# Altium footprint library ST封装.PcbLib: 1336 footprints (part 84 of 109) (continued)
## SQFP24X24-304(N) [mm] (continued)
Top Overlay:
  lines w0.2: -0.4,-23.1 -0.4,-24.35 0.85,-24.35 ; -0.4,0.6 -0.4,1.05 0.4,1.85 0.85,1.85 ; 24.55,-24.35 25.8,-24.35 25.8,-23.1 ; 24.55,1.85 25.8,1.85 25.8,0.6

## SQFP24X24-304(T) [mm]
pads (304):
  rect 0.2x1.6 smd: 1(0,0)
  oval 0.2x1.6 smd: 2(-0.3,0) 3(-0.6,0) 4(-0.9,0) 5(-1.2,0) 6(-1.5,0) 7(-1.8,0) 8(-2.1,0) 9(-2.4,0) 10(-2.7,0) 11(-3,0) 12(-3.3,0) 13(-3.6,0) 14(-3.9,0) 15(-4.2,0) 16(-4.5,0) 17(-4.8,0) 18(-5.1,0) 19(-5.4,0) 20(-5.7,0) 21(-6,0) 22(-6.3,0) 23(-6.6,0) 24(-6.9,0) 25(-7.2,0) 26(-7.5,0) 27(-7.8,0) 28(-8.1,0) 29(-8.4,0) 30(-8.7,0) 31(-9,0) 32(-9.3,0) 33(-9.6,0) 34(-9.9,0) 35(-10.2,0) 36(-10.5,0) 37(-10.8,0) 38(-11.1,0) 115(-11.1,-25.4) 116(-10.8,-25.4) 117(-10.5,-25.4) 118(-10.2,-25.4) 119(-9.9,-25.4) 120(-9.6,-25.4) 121(-9.3,-25.4) 122(-9,-25.4) 123(-8.7,-25.4) 124(-8.4,-25.4) 125(-8.1,-25.4) 126(-7.8,-25.4) 127(-7.5,-25.4) 128(-7.2,-25.4) 129(-6.9,-25.4) 130(-6.6,-25.4) 131(-6.3,-25.4) 132(-6,-25.4) 133(-5.7,-25.4) 134(-5.4,-25.4) 135(-5.1,-25.4) 136(-4.8,-25.4) 137(-4.5,-25.4) 138(-4.2,-25.4) 139(-3.9,-25.4) 140(-3.6,-25.4) 141(-3.3,-25.4) 142(-3,-25.4) 143(-2.7,-25.4) 144(-2.4,-25.4) 145(-2.1,-25.4) 146(-1.8,-25.4) 147(-1.5,-25.4) 148(-1.2,-25.4) 149(-0.9,-25.4) 150(-0.6,-25.4) 151(-0.3,-25.4) 152(0,-25.4) 153(0.3,-25.4) 154(0.6,-25.4) 155(0.9,-25.4) 156(1.2,-25.4) 157(1.5,-25.4) 158(1.8,-25.4) 159(2.1,-25.4) 160(2.4,-25.4) 161(2.7,-25.4) 162(3,-25.4) 163(3.3,-25.4) 164(3.6,-25.4) 165(3.9,-25.4) 166(4.2,-25.4) 167(4.5,-25.4) 168(4.8,-25.4) 169(5.1,-25.4) 170(5.4,-25.4) 171(5.7,-25.4) 172(6,-25.4) 173(6.3,-25.4) 174(6.6,-25.4) 175(6.9,-25.4) 176(7.2,-25.4) 177(7.5,-25.4) 178(7.8,-25.4) 179(8.1,-25.4) 180(8.4,-25.4) 181(8.7,-25.4) 182(9,-25.4) 183(9.3,-25.4) 184(9.6,-25.4) 185(9.9,-25.4) 186(10.2,-25.4) 187(10.5,-25.4) 188(10.8,-25.4) 189(11.1,-25.4) 190(11.4,-25.4) 267(11.4,0) 268(11.1,0) 269(10.8,0) 270(10.5,0) 271(10.2,0) 272(9.9,0) 273(9.6,0) 274(9.3,0) 275(9,0) 276(8.7,0) 277(8.4,0) 278(8.1,0) 279(7.8,0) 280(7.5,0) 281(7.2,0) 282(6.9,0) 283(6.6,0) 284(6.3,0) 285(6,0) 286(5.7,0) 287(5.4,0) 288(5.1,0) 289(4.8,0) 290(4.5,0) 291(4.2,0) 292(3.9,0) 293(3.6,0) 294(3.3,0) 295(3,0) 296(2.7,0) 297(2.4,0) 298(2.1,0) 299(1.8,0) 300(1.5,0) 301(1.2,0) 302(0.9,0) 303(0.6,0) 304(0.3,0)
  oval 1.6x0.2 smd: 39(-12.55,-1.45) 40(-12.55,-1.75) 41(-12.55,-2.05) 42(-12.55,-2.35) 43(-12.55,-2.65) 44(-12.55,-2.95) 45(-12.55,-3.25) 46(-12.55,-3.55) 47(-12.55,-3.85) 48(-12.55,-4.15) 49(-12.55,-4.45) 50(-12.55,-4.75) 51(-12.55,-5.05) 52(-12.55,-5.35) 53(-12.55,-5.65) 54(-12.55,-5.95) 55(-12.55,-6.25) 56(-12.55,-6.55) 57(-12.55,-6.85) 58(-12.55,-7.15) 59(-12.55,-7.45) 60(-12.55,-7.75) 61(-12.55,-8.05) 62(-12.55,-8.35) 63(-12.55,-8.65) 64(-12.55,-8.95) 65(-12.55,-9.25) 66(-12.55,-9.55) 67(-12.55,-9.85) 68(-12.55,-10.15) 69(-12.55,-10.45) 70(-12.55,-10.75) 71(-12.55,-11.05) 72(-12.55,-11.35) 73(-12.55,-11.65) 74(-12.55,-11.95) 75(-12.55,-12.25) 76(-12.55,-12.55) 77(-12.55,-12.85) 78(-12.55,-13.15) 79(-12.55,-13.45) 80(-12.55,-13.75) 81(-12.55,-14.05) 82(-12.55,-14.35) 83(-12.55,-14.65) 84(-12.55,-14.95) 85(-12.55,-15.25) 86(-12.55,-15.55) 87(-12.55,-15.85) 88(-12.55,-16.15) 89(-12.55,-16.45) 90(-12.55,-16.75) 91(-12.55,-17.05) 92(-12.55,-17.35) 93(-12.55,-17.65) 94(-12.55,-17.95) 95(-12.55,-18.25) 96(-12.55,-18.55) 97(-12.55,-18.85) 98(-12.55,-19.15) 99(-12.55,-19.45) 100(-12.55,-19.75) 101(-12.55,-20.05) 102(-12.55,-20.35) 103(-12.55,-20.65) 104(-12.55,-20.95) 105(-12.55,-21.25) 106(-12.55,-21.55) 107(-12.55,-21.85) 108(-12.55,-22.15) 109(-12.55,-22.45) 110(-12.55,-22.75) 111(-12.55,-23.05) 112(-12.55,-23.35) 113(-12.55,-23.65) 114(-12.55,-23.95) 191(12.85,-23.95) 192(12.85,-23.65) 193(12.85,-23.35) 194(12.85,-23.05) 195(12.85,-22.75) 196(12.85,-22.45) 197(12.85,-22.15) 198(12.85,-21.85) 199(12.85,-21.55) 200(12.85,-21.25) 201(12.85,-20.95) 202(12.85,-20.65) 203(12.85,-20.35) 204(12.85,-20.05) 205(12.85,-19.75) 206(12.85,-19.45) 207(12.85,-19.15) 208(12.85,-18.85) 209(12.85,-18.55) 210(12.85,-18.25) 211(12.85,-17.95) 212(12.85,-17.65) 213(12.85,-17.35) 214(12.85,-17.05) 215(12.85,-16.75) 216(12.85,-16.45) 217(12.85,-16.15) 218(12.85,-15.85) 219(12.85,-15.55) 220(12.85,-15.25) 221(12.85,-14.95) 222(12.85,-14.65) 223(12.85,-14.35) 224(12.85,-14.05) 225(12.85,-13.75) 226(12.85,-13.45) 227(12.85,-13.15) 228(12.85,-12.85) 229(12.85,-12.55) 230(12.85,-12.25) 231(12.85,-11.95) 232(12.85,-11.65) 233(12.85,-11.35) 234(12.85,-11.05) 235(12.85,-10.75) 236(12.85,-10.45) 237(12.85,-10.15) 238(12.85,-9.85) 239(12.85,-9.55) 240(12.85,-9.25) 241(12.85,-8.95) 242(12.85,-8.65) 243(12.85,-8.35) 244(12.85,-8.05) 245(12.85,-7.75) 246(12.85,-7.45) 247(12.85,-7.15) 248(12.85,-6.85) 249(12.85,-6.55) 250(12.85,-6.25) 251(12.85,-5.95) 252(12.85,-5.65) 253(12.85,-5.35) 254(12.85,-5.05) 255(12.85,-4.75) 256(12.85,-4.45) 257(12.85,-4.15) 258(12.85,-3.85) 259(12.85,-3.55) 260(12.85,-3.25) 261(12.85,-2.95) 262(12.85,-2.65) 263(12.85,-2.35) 264(12.85,-2.05) 265(12.85,-1.75) 266(12.85,-1.45)
Top Overlay:
  lines w0.2: -12.95,-24.55 -12.95,-25.8 -11.7,-25.8 ; -12.95,-0.85 -12.95,-0.4 -12.15,0.4 -11.7,0.4 ; 12,-25.8 13.25,-25.8 13.25,-24.55 ; 12,0.4 13.25,0.4 13.25,-0.85

## SQFP28X28-208(N) [mm]
pads (208):
  rect 1.6x0.4 smd: 1(0,0)
  oval 1.6x0.4 smd: 2(0,-0.5) 3(0,-1) 4(0,-1.5) 5(0,-2) 6(0,-2.5) 7(0,-3) 8(0,-3.5) 9(0,-4) 10(0,-4.5) 11(0,-5) 12(0,-5.5) 13(0,-6) 14(0,-6.5) 15(0,-7) 16(0,-7.5) 17(0,-8) 18(0,-8.5) 19(0,-9) 20(0,-9.5) 21(0,-10) 22(0,-10.5) 23(0,-11) 24(0,-11.5) 25(0,-12) 26(0,-12.5) 27(0,-13) 28(0,-13.5) 29(0,-14) 30(0,-14.5) 31(0,-15) 32(0,-15.5) 33(0,-16) 34(0,-16.5) 35(0,-17) 36(0,-17.5) 37(0,-18) 38(0,-18.5) 39(0,-19) 40(0,-19.5) 41(0,-20) 42(0,-20.5) 43(0,-21) 44(0,-21.5) 45(0,-22) 46(0,-22.5) 47(0,-23) 48(0,-23.5) 49(0,-24) 50(0,-24.5) 51(0,-25) 52(0,-25.5) 105(29.4,-25.5) 106(29.4,-25) 107(29.4,-24.5) 108(29.4,-24) 109(29.4,-23.5) 110(29.4,-23) 111(29.4,-22.5) 112(29.4,-22) 113(29.4,-21.5) 114(29.4,-21) 115(29.4,-20.5) 116(29.4,-20) 117(29.4,-19.5) 118(29.4,-19) 119(29.4,-18.5) 120(29.4,-18) 121(29.4,-17.5) 122(29.4,-17) 123(29.4,-16.5) 124(29.4,-16) 125(29.4,-15.5) 126(29.4,-15) 127(29.4,-14.5) 128(29.4,-14) 129(29.4,-13.5) 130(29.4,-13) 131(29.4,-12.5) 132(29.4,-12) 133(29.4,-11.5) 134(29.4,-11) 135(29.4,-10.5) 136(29.4,-10) 137(29.4,-9.5) 138(29.4,-9) 139(29.4,-8.5) 140(29.4,-8) 141(29.4,-7.5) 142(29.4,-7) 143(29.4,-6.5) 144(29.4,-6) 145(29.4,-5.5) 146(29.4,-5) 147(29.4,-4.5) 148(29.4,-4) 149(29.4,-3.5) 150(29.4,-3) 151(29.4,-2.5) 152(29.4,-2) 153(29.4,-1.5) 154(29.4,-1) 155(29.4,-0.5) 156(29.4,0)
  oval 0.4x1.6 smd: 53(1.95,-27.45) 54(2.45,-27.45) 55(2.95,-27.45) 56(3.45,-27.45) 57(3.95,-27.45) 58(4.45,-27.45) 59(4.95,-27.45) 60(5.45,-27.45) 61(5.95,-27.45) 62(6.45,-27.45) 63(6.95,-27.45) 64(7.45,-27.45) 65(7.95,-27.45) 66(8.45,-27.45) 67(8.95,-27.45) 68(9.45,-27.45) 69(9.95,-27.45) 70(10.45,-27.45) 71(10.95,-27.45) 72(11.45,-27.45) 73(11.95,-27.45) 74(12.45,-27.45) 75(12.95,-27.45) 76(13.45,-27.45) 77(13.95,-27.45) 78(14.45,-27.45) 79(14.95,-27.45) 80(15.45,-27.45) 81(15.95,-27.45) 82(16.45,-27.45) 83(16.95,-27.45) 84(17.45,-27.45) 85(17.95,-27.45) 86(18.45,-27.45) 87(18.95,-27.45) 88(19.45,-27.45) 89(19.95,-27.45) 90(20.45,-27.45) 91(20.95,-27.45) 92(21.45,-27.45) 93(21.95,-27.45) 94(22.45,-27.45) 95(22.95,-27.45) 96(23.45,-27.45) 97(23.95,-27.45) 98(24.45,-27.45) 99(24.95,-27.45) 100(25.45,-27.45) 101(25.95,-27.45) 102(26.45,-27.45) 103(26.95,-27.45) 104(27.45,-27.45) 157(27.45,1.95) 158(26.95,1.95) 159(26.45,1.95) 160(25.95,1.95) 161(25.45,1.95) 162(24.95,1.95) 163(24.45,1.95) 164(23.95,1.95) 165(23.45,1.95) 166(22.95,1.95) 167(22.45,1.95) 168(21.95,1.95) 169(21.45,1.95) 170(20.95,1.95) 171(20.45,1.95) 172(19.95,1.95) 173(19.45,1.95) 174(18.95,1.95) 175(18.45,1.95) 176(17.95,1.95) 177(17.45,1.95) 178(16.95,1.95) 179(16.45,1.95) 180(15.95,1.95) 181(15.45,1.95) 182(14.95,1.95) 183(14.45,1.95) 184(13.95,1.95) 185(13.45,1.95) 186(12.95,1.95) 187(12.45,1.95) 188(11.95,1.95) 189(11.45,1.95) 190(10.95,1.95) 191(10.45,1.95) 192(9.95,1.95) 193(9.45,1.95) 194(8.95,1.95) 195(8.45,1.95) 196(7.95,1.95) 197(7.45,1.95) 198(6.95,1.95) 199(6.45,1.95) 200(5.95,1.95) 201(5.45,1.95) 202(4.95,1.95) 203(4.45,1.95) 204(3.95,1.95) 205(3.45,1.95) 206(2.95,1.95) 207(2.45,1.95) 208(1.95,1.95)
Top Overlay:
  lines w0.2: -0.4,-26.2 -0.4,-27.85 1.25,-27.85 ; -0.4,0.7 -0.4,1.55 0.4,2.35 1.25,2.35 ; 28.15,-27.85 29.8,-27.85 29.8,-26.2 ; 28.15,2.35 29.8,2.35 29.8,0.7

## SQFP28X28-216(N) [mm]
pads (216):
  rect 1.6x0.4 smd: 1(0,0)
  oval 1.6x0.4 smd: 2(0,-0.5) 3(0,-1) 4(0,-1.5) 5(0,-2) 6(0,-2.5) 7(0,-3) 8(0,-3.5) 9(0,-4) 10(0,-4.5) 11(0,-5) 12(0,-5.5) 13(0,-6) 14(0,-6.5) 15(0,-7) 16(0,-7.5) 17(0,-8) 18(0,-8.5) 19(0,-9) 20(0,-9.5) 21(0,-10) 22(0,-10.5) 23(0,-11) 24(0,-11.5) 25(0,-12) 26(0,-12.5) 27(0,-13) 28(0,-13.5) 29(0,-14) 30(0,-14.5) 31(0,-15) 32(0,-15.5) 33(0,-16) 34(0,-16.5) 35(0,-17) 36(0,-17.5) 37(0,-18) 38(0,-18.5) 39(0,-19) 40(0,-19.5) 41(0,-20) 42(0,-20.5) 43(0,-21) 44(0,-21.5) 45(0,-22) 46(0,-22.5) 47(0,-23) 48(0,-23.5) 49(0,-24) 50(0,-24.5) 51(0,-25) 52(0,-25.5) 53(0,-26) 54(0,-26.5) 109(29.4,-26.5) 110(29.4,-26) 111(29.4,-25.5) 112(29.4,-25) 113(29.4,-24.5) 114(29.4,-24) 115(29.4,-23.5) 116(29.4,-23) 117(29.4,-22.5) 118(29.4,-22) 119(29.4,-21.5) 120(29.4,-21) 121(29.4,-20.5) 122(29.4,-20) 123(29.4,-19.5) 124(29.4,-19) 125(29.4,-18.5) 126(29.4,-18) 127(29.4,-17.5) 128(29.4,-17) 129(29.4,-16.5) 130(29.4,-16) 131(29.4,-15.5) 132(29.4,-15) 133(29.4,-14.5) 134(29.4,-14) 135(29.4,-13.5) 136(29.4,-13) 137(29.4,-12.5) 138(29.4,-12) 139(29.4,-11.5) 140(29.4,-11) 141(29.4,-10.5) 142(29.4,-10) 143(29.4,-9.5) 144(29.4,-9) 145(29.4,-8.5) 146(29.4,-8) 147(29.4,-7.5) 148(29.4,-7) 149(29.4,-6.5) 150(29.4,-6) 151(29.4,-5.5) 152(29.4,-5) 153(29.4,-4.5) 154(29.4,-4) 155(29.4,-3.5) 156(29.4,-3) 157(29.4,-2.5) 158(29.4,-2) 159(29.4,-1.5) 160(29.4,-1) 161(29.4,-0.5) 162(29.4,0)
  oval 0.4x1.6 smd: 55(1.45,-27.95) 56(1.95,-27.95) 57(2.45,-27.95) 58(2.95,-27.95) 59(3.45,-27.95) 60(3.95,-27.95) 61(4.45,-27.95) 62(4.95,-27.95) 63(5.45,-27.95) 64(5.95,-27.95) 65(6.45,-27.95) 66(6.95,-27.95) 67(7.45,-27.95) 68(7.95,-27.95) 69(8.45,-27.95) 70(8.95,-27.95) 71(9.45,-27.95) 72(9.95,-27.95) 73(10.45,-27.95) 74(10.95,-27.95) 75(11.45,-27.95) 76(11.95,-27.95) 77(12.45,-27.95) 78(12.95,-27.95) 79(13.45,-27.95) 80(13.95,-27.95) 81(14.45,-27.95) 82(14.95,-27.95) 83(15.45,-27.95) 84(15.95,-27.95) 85(16.45,-27.95) 86(16.95,-27.95) 87(17.45,-27.95) 88(17.95,-27.95) 89(18.45,-27.95) 90(18.95,-27.95) 91(19.45,-27.95) 92(19.95,-27.95) 93(20.45,-27.95) 94(20.95,-27.95) 95(21.45,-27.95) 96(21.95,-27.95) 97(22.45,-27.95) 98(22.95,-27.95) 99(23.45,-27.95) 100(23.95,-27.95) 101(24.45,-27.95) 102(24.95,-27.95) 103(25.45,-27.95) 104(25.95,-27.95) 105(26.45,-27.95) 106(26.95,-27.95) 107(27.45,-27.95) 108(27.95,-27.95) 163(27.95,1.45) 164(27.45,1.45) 165(26.95,1.45) 166(26.45,1.45) 167(25.95,1.45) 168(25.45,1.45) 169(24.95,1.45) 170(24.45,1.45) 171(23.95,1.45) 172(23.45,1.45) 173(22.95,1.45) 174(22.45,1.45) 175(21.95,1.45) 176(21.45,1.45) 177(20.95,1.45) 178(20.45,1.45) 179(19.95,1.45) 180(19.45,1.45) 181(18.95,1.45) 182(18.45,1.45) 183(17.95,1.45) 184(17.45,1.45) 185(16.95,1.45) 186(16.45,1.45) 187(15.95,1.45) 188(15.45,1.45) 189(14.95,1.45) 190(14.45,1.45) 191(13.95,1.45) 192(13.45,1.45) 193(12.95,1.45) 194(12.45,1.45) 195(11.95,1.45) 196(11.45,1.45) 197(10.95,1.45) 198(10.45,1.45) 199(9.95,1.45) 200(9.45,1.45) 201(8.95,1.45) 202(8.45,1.45) 203(7.95,1.45) 204(7.45,1.45) 205(6.95,1.45) 206(6.45,1.45) 207(5.95,1.45) 208(5.45,1.45) 209(4.95,1.45) 210(4.45,1.45) 211(3.95,1.45) 212(3.45,1.45) 213(2.95,1.45) 214(2.45,1.45) 215(1.95,1.45) 216(1.45,1.45)
Top Overlay:
  lines w0.2: -0.4,-27.2 -0.4,-28.35 0.75,-28.35 ; -0.4,0.7 -0.4,1.05 0.4,1.85 0.75,1.85 ; 28.65,-28.35 29.8,-28.35 29.8,-27.2 ; 28.65,1.85 29.8,1.85 29.8,0.7

## SQFP28X28-216(T) [mm]
pads (216):
  rect 0.4x1.6 smd: 1(0,0)
  oval 0.4x1.6 smd: 2(-0.5,0) 3(-1,0) 4(-1.5,0) 5(-2,0) 6(-2.5,0) 7(-3,0) 8(-3.5,0) 9(-4,0) 10(-4.5,0) 11(-5,0) 12(-5.5,0) 13(-6,0) 14(-6.5,0) 15(-7,0) 16(-7.5,0) 17(-8,0) 18(-8.5,0) 19(-9,0) 20(-9.5,0) 21(-10,0) 22(-10.5,0) 23(-11,0) 24(-11.5,0) 25(-12,0) 26(-12.5,0) 27(-13,0) 82(-13,-29.4) 83(-12.5,-29.4) 84(-12,-29.4) 85(-11.5,-29.4) 86(-11,-29.4) 87(-10.5,-29.4) 88(-10,-29.4) 89(-9.5,-29.4) 90(-9,-29.4) 91(-8.5,-29.4) 92(-8,-29.4) 93(-7.5,-29.4) 94(-7,-29.4) 95(-6.5,-29.4) 96(-6,-29.4) 97(-5.5,-29.4) 98(-5,-29.4) 99(-4.5,-29.4) 100(-4,-29.4) 101(-3.5,-29.4) 102(-3,-29.4) 103(-2.5,-29.4) 104(-2,-29.4) 105(-1.5,-29.4) 106(-1,-29.4) 107(-0.5,-29.4) 108(0,-29.4) 109(0.5,-29.4) 110(1,-29.4) 111(1.5,-29.4) 112(2,-29.4) 113(2.5,-29.4) 114(3,-29.4) 115(3.5,-29.4) 116(4,-29.4) 117(4.5,-29.4) 118(5,-29.4) 119(5.5,-29.4) 120(6,-29.4) 121(6.5,-29.4) 122(7,-29.4) 123(7.5,-29.4) 124(8,-29.4) 125(8.5,-29.4) 126(9,-29.4) 127(9.5,-29.4) 128(10,-29.4) 129(10.5,-29.4) 130(11,-29.4) 131(11.5,-29.4) 132(12,-29.4) 133(12.5,-29.4) 134(13,-29.4) 135(13.5,-29.4) 190(13.5,0) 191(13,0) 192(12.5,0) 193(12,0) 194(11.5,0) 195(11,0) 196(10.5,0) 197(10,0) 198(9.5,0) 199(9,0) 200(8.5,0) 201(8,0) 202(7.5,0) 203(7,0) 204(6.5,0) 205(6,0) 206(5.5,0) 207(5,0) 208(4.5,0) 209(4,0) 210(3.5,0) 211(3,0) 212(2.5,0) 213(2,0) 214(1.5,0) 215(1,0) 216(0.5,0)
  oval 1.6x0.4 smd: 28(-14.45,-1.45) 29(-14.45,-1.95) 30(-14.45,-2.45) 31(-14.45,-2.95) 32(-14.45,-3.45) 33(-14.45,-3.95) 34(-14.45,-4.45) 35(-14.45,-4.95) 36(-14.45,-5.45) 37(-14.45,-5.95) 38(-14.45,-6.45) 39(-14.45,-6.95) 40(-14.45,-7.45) 41(-14.45,-7.95) 42(-14.45,-8.45) 43(-14.45,-8.95) 44(-14.45,-9.45) 45(-14.45,-9.95) 46(-14.45,-10.45) 47(-14.45,-10.95) 48(-14.45,-11.45) 49(-14.45,-11.95) 50(-14.45,-12.45) 51(-14.45,-12.95) 52(-14.45,-13.45) 53(-14.45,-13.95) 54(-14.45,-14.45) 55(-14.45,-14.95) 56(-14.45,-15.45) 57(-14.45,-15.95) 58(-14.45,-16.45) 59(-14.45,-16.95) 60(-14.45,-17.45) 61(-14.45,-17.95) 62(-14.45,-18.45) 63(-14.45,-18.95) 64(-14.45,-19.45) 65(-14.45,-19.95) 66(-14.45,-20.45) 67(-14.45,-20.95) 68(-14.45,-21.45) 69(-14.45,-21.95) 70(-14.45,-22.45) 71(-14.45,-22.95) 72(-14.45,-23.45) 73(-14.45,-23.95) 74(-14.45,-24.45) 75(-14.45,-24.95) 76(-14.45,-25.45) 77(-14.45,-25.95) 78(-14.45,-26.45) 79(-14.45,-26.95) 80(-14.45,-27.45) 81(-14.45,-27.95) 136(14.95,-27.95) 137(14.95,-27.45) 138(14.95,-26.95) 139(14.95,-26.45) 140(14.95,-25.95) 141(14.95,-25.45) 142(14.95,-24.95) 143(14.95,-24.45) 144(14.95,-23.95) 145(14.95,-23.45) 146(14.95,-22.95) 147(14.95,-22.45) 148(14.95,-21.95) 149(14.95,-21.45) 150(14.95,-20.95) 151(14.95,-20.45) 152(14.95,-19.95) 153(14.95,-19.45) 154(14.95,-18.95) 155(14.95,-18.45) 156(14.95,-17.95) 157(14.95,-17.45) 158(14.95,-16.95) 159(14.95,-16.45) 160(14.95,-15.95) 161(14.95,-15.45) 162(14.95,-14.95) 163(14.95,-14.45) 164(14.95,-13.95) 165(14.95,-13.45) 166(14.95,-12.95) 167(14.95,-12.45) 168(14.95,-11.95) 169(14.95,-11.45) 170(14.95,-10.95) 171(14.95,-10.45) 172(14.95,-9.95) 173(14.95,-9.45) 174(14.95,-8.95) 175(14.95,-8.45) 176(14.95,-7.95) 177(14.95,-7.45) 178(14.95,-6.95) 179(14.95,-6.45) 180(14.95,-5.95) 181(14.95,-5.45) 182(14.95,-4.95) 183(14.95,-4.45) 184(14.95,-3.95) 185(14.95,-3.45) 186(14.95,-2.95) 187(14.95,-2.45) 188(14.95,-1.95) 189(14.95,-1.45)
Top Overlay:
  lines w0.2: -14.85,-28.65 -14.85,-29.8 -13.7,-29.8 ; -14.85,-0.75 -14.85,-0.4 -14.05,0.4 -13.7,0.4 ; 14.2,-29.8 15.35,-29.8 15.35,-28.65 ; 14.2,0.4 15.35,0.4 15.35,-0.75

## SQFP28X28-264(N) [mm]
pads (264):
  rect 1.6x0.3 smd: 1(0,0)
  oval 1.6x0.3 smd: 2(0,-0.4) 3(0,-0.8) 4(0,-1.2) 5(0,-1.6) 6(0,-2) 7(0,-2.4) 8(0,-2.8) 9(0,-3.2) 10(0,-3.6) 11(0,-4) 12(0,-4.4) 13(0,-4.8) 14(0,-5.2) 15(0,-5.6) 16(0,-6) 17(0,-6.4) 18(0,-6.8) 19(0,-7.2) 20(0,-7.6) 21(0,-8) 22(0,-8.4) 23(0,-8.8) 24(0,-9.2) 25(0,-9.6) 26(0,-10) 27(0,-10.4) 28(0,-10.8) 29(0,-11.2) 30(0,-11.6) 31(0,-12) 32(0,-12.4) 33(0,-12.8) 34(0,-13.2) 35(0,-13.6) 36(0,-14) 37(0,-14.4) 38(0,-14.8) 39(0,-15.2) 40(0,-15.6) 41(0,-16) 42(0,-16.4) 43(0,-16.8) 44(0,-17.2) 45(0,-17.6) 46(0,-18) 47(0,-18.4) 48(0,-18.8) 49(0,-19.2) 50(0,-19.6) 51(0,-20) 52(0,-20.4) 53(0,-20.8) 54(0,-21.2) 55(0,-21.6) 56(0,-22) 57(0,-22.4) 58(0,-22.8) 59(0,-23.2) 60(0,-23.6) 61(0,-24) 62(0,-24.4) 63(0,-24.8) 64(0,-25.2) 65(0,-25.6) 66(0,-26) 133(29.4,-26) 134(29.4,-25.6) 135(29.4,-25.2) 136(29.4,-24.8) 137(29.4,-24.4) 138(29.4,-24) 139(29.4,-23.6) 140(29.4,-23.2) 141(29.4,-22.8) 142(29.4,-22.4) 143(29.4,-22) 144(29.4,-21.6) 145(29.4,-21.2) 146(29.4,-20.8) 147(29.4,-20.4) 148(29.4,-20) 149(29.4,-19.6) 150(29.4,-19.2) 151(29.4,-18.8) 152(29.4,-18.4) 153(29.4,-18) 154(29.4,-17.6) 155(29.4,-17.2) 156(29.4,-16.8) 157(29.4,-16.4) 158(29.4,-16) 159(29.4,-15.6) 160(29.4,-15.2) 161(29.4,-14.8) 162(29.4,-14.4) 163(29.4,-14) 164(29.4,-13.6) 165(29.4,-13.2) 166(29.4,-12.8) 167(29.4,-12.4) 168(29.4,-12) 169(29.4,-11.6) 170(29.4,-11.2) 171(29.4,-10.8) 172(29.4,-10.4) 173(29.4,-10) 174(29.4,-9.6) 175(29.4,-9.2) 176(29.4,-8.8) 177(29.4,-8.4) 178(29.4,-8) 179(29.4,-7.6) 180(29.4,-7.2) 181(29.4,-6.8) 182(29.4,-6.4) 183(29.4,-6) 184(29.4,-5.6) 185(29.4,-5.2) 186(29.4,-4.8) 187(29.4,-4.4) 188(29.4,-4) 189(29.4,-3.6) 190(29.4,-3.2) 191(29.4,-2.8) 192(29.4,-2.4) 193(29.4,-2) 194(29.4,-1.6) 195(29.4,-1.2) 196(29.4,-0.8) 197(29.4,-0.4) 198(29.4,0)
  oval 0.3x1.6 smd: 67(1.7,-27.7) 68(2.1,-27.7) 69(2.5,-27.7) 70(2.9,-27.7) 71(3.3,-27.7) 72(3.7,-27.7) 73(4.1,-27.7) 74(4.5,-27.7) 75(4.9,-27.7) 76(5.3,-27.7) 77(5.7,-27.7) 78(6.1,-27.7) 79(6.5,-27.7) 80(6.9,-27.7) 81(7.3,-27.7) 82(7.7,-27.7) 83(8.1,-27.7) 84(8.5,-27.7) 85(8.9,-27.7) 86(9.3,-27.7) 87(9.7,-27.7) 88(10.1,-27.7) 89(10.5,-27.7) 90(10.9,-27.7) 91(11.3,-27.7) 92(11.7,-27.7) 93(12.1,-27.7) 94(12.5,-27.7) 95(12.9,-27.7) 96(13.3,-27.7) 97(13.7,-27.7) 98(14.1,-27.7) 99(14.5,-27.7) 100(14.9,-27.7) 101(15.3,-27.7) 102(15.7,-27.7) 103(16.1,-27.7) 104(16.5,-27.7) 105(16.9,-27.7) 106(17.3,-27.7) 107(17.7,-27.7) 108(18.1,-27.7) 109(18.5,-27.7) 110(18.9,-27.7) 111(19.3,-27.7) 112(19.7,-27.7) 113(20.1,-27.7) 114(20.5,-27.7) 115(20.9,-27.7) 116(21.3,-27.7) 117(21.7,-27.7) 118(22.1,-27.7) 119(22.5,-27.7) 120(22.9,-27.7) 121(23.3,-27.7) 122(23.7,-27.7) 123(24.1,-27.7) 124(24.5,-27.7) 125(24.9,-27.7) 126(25.3,-27.7) 127(25.7,-27.7) 128(26.1,-27.7) 129(26.5,-27.7) 130(26.9,-27.7) 131(27.3,-27.7) 132(27.7,-27.7) 199(27.7,1.7) 200(27.3,1.7) 201(26.9,1.7) 202(26.5,1.7) 203(26.1,1.7) 204(25.7,1.7) 205(25.3,1.7) 206(24.9,1.7) 207(24.5,1.7) 208(24.1,1.7) 209(23.7,1.7) 210(23.3,1.7) 211(22.9,1.7) 212(22.5,1.7) 213(22.1,1.7) 214(21.7,1.7) 215(21.3,1.7) 216(20.9,1.7) 217(20.5,1.7) 218(20.1,1.7) 219(19.7,1.7) 220(19.3,1.7) 221(18.9,1.7) 222(18.5,1.7) 223(18.1,1.7) 224(17.7,1.7) 225(17.3,1.7) 226(16.9,1.7) 227(16.5,1.7) 228(16.1,1.7) 229(15.7,1.7) 230(15.3,1.7) 231(14.9,1.7) 232(14.5,1.7) 233(14.1,1.7) 234(13.7,1.7) 235(13.3,1.7) 236(12.9,1.7) 237(12.5,1.7) 238(12.1,1.7) 239(11.7,1.7) 240(11.3,1.7) 241(10.9,1.7) 242(10.5,1.7) 243(10.1,1.7) 244(9.7,1.7) 245(9.3,1.7) 246(8.9,1.7) 247(8.5,1.7) 248(8.1,1.7) 249(7.7,1.7) 250(7.3,1.7) 251(6.9,1.7) 252(6.5,1.7) 253(6.1,1.7) 254(5.7,1.7) 255(5.3,1.7) 256(4.9,1.7) 257(4.5,1.7) 258(4.1,1.7) 259(3.7,1.7) 260(3.3,1.7) 261(2.9,1.7) 262(2.5,1.7) 263(2.1,1.7) 264(1.7,1.7)
Top Overlay:
  lines w0.2: -0.4,-26.65 -0.4,-28.1 1.05,-28.1 ; -0.4,0.65 -0.4,1.3 0.4,2.1 1.05,2.1 ; 28.35,-28.1 29.8,-28.1 29.8,-26.65 ; 28.35,2.1 29.8,2.1 29.8,0.65

## SQFP28X28-264(T) [mm]
pads (264):
  rect 0.3x1.6 smd: 1(0,0)
  oval 0.3x1.6 smd: 2(-0.4,0) 3(-0.8,0) 4(-1.2,0) 5(-1.6,0) 6(-2,0) 7(-2.4,0) 8(-2.8,0) 9(-3.2,0) 10(-3.6,0) 11(-4,0) 12(-4.4,0) 13(-4.8,0) 14(-5.2,0) 15(-5.6,0) 16(-6,0) 17(-6.4,0) 18(-6.8,0) 19(-7.2,0) 20(-7.6,0) 21(-8,0) 22(-8.4,0) 23(-8.8,0) 24(-9.2,0) 25(-9.6,0) 26(-10,0) 27(-10.4,0) 28(-10.8,0) 29(-11.2,0) 30(-11.6,0) 31(-12,0) 32(-12.4,0) 33(-12.8,0) 100(-12.8,-29.4) 101(-12.4,-29.4) 102(-12,-29.4) 103(-11.6,-29.4) 104(-11.2,-29.4) 105(-10.8,-29.4) 106(-10.4,-29.4) 107(-10,-29.4) 108(-9.6,-29.4) 109(-9.2,-29.4) 110(-8.8,-29.4) 111(-8.4,-29.4) 112(-8,-29.4) 113(-7.6,-29.4) 114(-7.2,-29.4) 115(-6.8,-29.4) 116(-6.4,-29.4) 117(-6,-29.4) 118(-5.6,-29.4) 119(-5.2,-29.4) 120(-4.8,-29.4) 121(-4.4,-29.4) 122(-4,-29.4) 123(-3.6,-29.4) 124(-3.2,-29.4) 125(-2.8,-29.4) 126(-2.4,-29.4) 127(-2,-29.4) 128(-1.6,-29.4) 129(-1.2,-29.4) 130(-0.8,-29.4) 131(-0.4,-29.4) 132(0,-29.4) 133(0.4,-29.4) 134(0.8,-29.4) 135(1.2,-29.4) 136(1.6,-29.4) 137(2,-29.4) 138(2.4,-29.4) 139(2.8,-29.4) 140(3.2,-29.4) 141(3.6,-29.4) 142(4,-29.4) 143(4.4,-29.4) 144(4.8,-29.4) 145(5.2,-29.4) 146(5.6,-29.4) 147(6,-29.4) 148(6.4,-29.4) 149(6.8,-29.4) 150(7.2,-29.4) 151(7.6,-29.4) 152(8,-29.4) 153(8.4,-29.4) 154(8.8,-29.4) 155(9.2,-29.4) 156(9.6,-29.4) 157(10,-29.4) 158(10.4,-29.4) 159(10.8,-29.4) 160(11.2,-29.4) 161(11.6,-29.4) 162(12,-29.4) 163(12.4,-29.4) 164(12.8,-29.4) 165(13.2,-29.4) 232(13.2,0) 233(12.8,0) 234(12.4,0) 235(12,0) 236(11.6,0) 237(11.2,0) 238(10.8,0) 239(10.4,0) 240(10,0) 241(9.6,0) 242(9.2,0) 243(8.8,0) 244(8.4,0) 245(8,0) 246(7.6,0) 247(7.2,0) 248(6.8,0) 249(6.4,0) 250(6,0) 251(5.6,0) 252(5.2,0) 253(4.8,0) 254(4.4,0) 255(4,0) 256(3.6,0) 257(3.2,0) 258(2.8,0) 259(2.4,0) 260(2,0) 261(1.6,0) 262(1.2,0) 263(0.8,0) 264(0.4,0)
  oval 1.6x0.3 smd: 34(-14.5,-1.7) 35(-14.5,-2.1) 36(-14.5,-2.5) 37(-14.5,-2.9) 38(-14.5,-3.3) 39(-14.5,-3.7) 40(-14.5,-4.1) 41(-14.5,-4.5) 42(-14.5,-4.9) 43(-14.5,-5.3) 44(-14.5,-5.7) 45(-14.5,-6.1) 46(-14.5,-6.5) 47(-14.5,-6.9) 48(-14.5,-7.3) 49(-14.5,-7.7) 50(-14.5,-8.1) 51(-14.5,-8.5) 52(-14.5,-8.9) 53(-14.5,-9.3) 54(-14.5,-9.7) 55(-14.5,-10.1) 56(-14.5,-10.5) 57(-14.5,-10.9) 58(-14.5,-11.3) 59(-14.5,-11.7) 60(-14.5,-12.1) 61(-14.5,-12.5) 62(-14.5,-12.9) 63(-14.5,-13.3) 64(-14.5,-13.7) 65(-14.5,-14.1) 66(-14.5,-14.5) 67(-14.5,-14.9) 68(-14.5,-15.3) 69(-14.5,-15.7) 70(-14.5,-16.1) 71(-14.5,-16.5) 72(-14.5,-16.9) 73(-14.5,-17.3) 74(-14.5,-17.7) 75(-14.5,-18.1) 76(-14.5,-18.5) 77(-14.5,-18.9) 78(-14.5,-19.3) 79(-14.5,-19.7) 80(-14.5,-20.1) 81(-14.5,-20.5) 82(-14.5,-20.9) 83(-14.5,-21.3) 84(-14.5,-21.7) 85(-14.5,-22.1) 86(-14.5,-22.5) 87(-14.5,-22.9) 88(-14.5,-23.3) 89(-14.5,-23.7) 90(-14.5,-24.1) 91(-14.5,-24.5) 92(-14.5,-24.9) 93(-14.5,-25.3) 94(-14.5,-25.7) 95(-14.5,-26.1) 96(-14.5,-26.5) 97(-14.5,-26.9) 98(-14.5,-27.3) 99(-14.5,-27.7) 166(14.9,-27.7) 167(14.9,-27.3) 168(14.9,-26.9) 169(14.9,-26.5) 170(14.9,-26.1) 171(14.9,-25.7) 172(14.9,-25.3) 173(14.9,-24.9) 174(14.9,-24.5) 175(14.9,-24.1) 176(14.9,-23.7) 177(14.9,-23.3) 178(14.9,-22.9) 179(14.9,-22.5) 180(14.9,-22.1) 181(14.9,-21.7) 182(14.9,-21.3) 183(14.9,-20.9) 184(14.9,-20.5) 185(14.9,-20.1) 186(14.9,-19.7) 187(14.9,-19.3) 188(14.9,-18.9) 189(14.9,-18.5) 190(14.9,-18.1) 191(14.9,-17.7) 192(14.9,-17.3) 193(14.9,-16.9) 194(14.9,-16.5) 195(14.9,-16.1) 196(14.9,-15.7) 197(14.9,-15.3) 198(14.9,-14.9) 199(14.9,-14.5) 200(14.9,-14.1) 201(14.9,-13.7) 202(14.9,-13.3) 203(14.9,-12.9) 204(14.9,-12.5) 205(14.9,-12.1) 206(14.9,-11.7) 207(14.9,-11.3) 208(14.9,-10.9) 209(14.9,-10.5) 210(14.9,-10.1) 211(14.9,-9.7) 212(14.9,-9.3) 213(14.9,-8.9) 214(14.9,-8.5) 215(14.9,-8.1) 216(14.9,-7.7) 217(14.9,-7.3) 218(14.9,-6.9) 219(14.9,-6.5) 220(14.9,-6.1) 221(14.9,-5.7) 222(14.9,-5.3) 223(14.9,-4.9) 224(14.9,-4.5) 225(14.9,-4.1) 226(14.9,-3.7) 227(14.9,-3.3) 228(14.9,-2.9) 229(14.9,-2.5) 230(14.9,-2.1) 231(14.9,-1.7)
Top Overlay:
  lines w0.2: -14.9,-28.35 -14.9,-29.8 -13.45,-29.8 ; -14.9,-1.05 -14.9,-0.4 -14.1,0.4 -13.45,0.4 ; 13.85,-29.8 15.3,-29.8 15.3,-28.35 ; 13.85,0.4 15.3,0.4 15.3,-1.05